# Altium schematic symbol library BARKO_SCHLIB.SchLib: 1064 symbols (part 2 of 11)
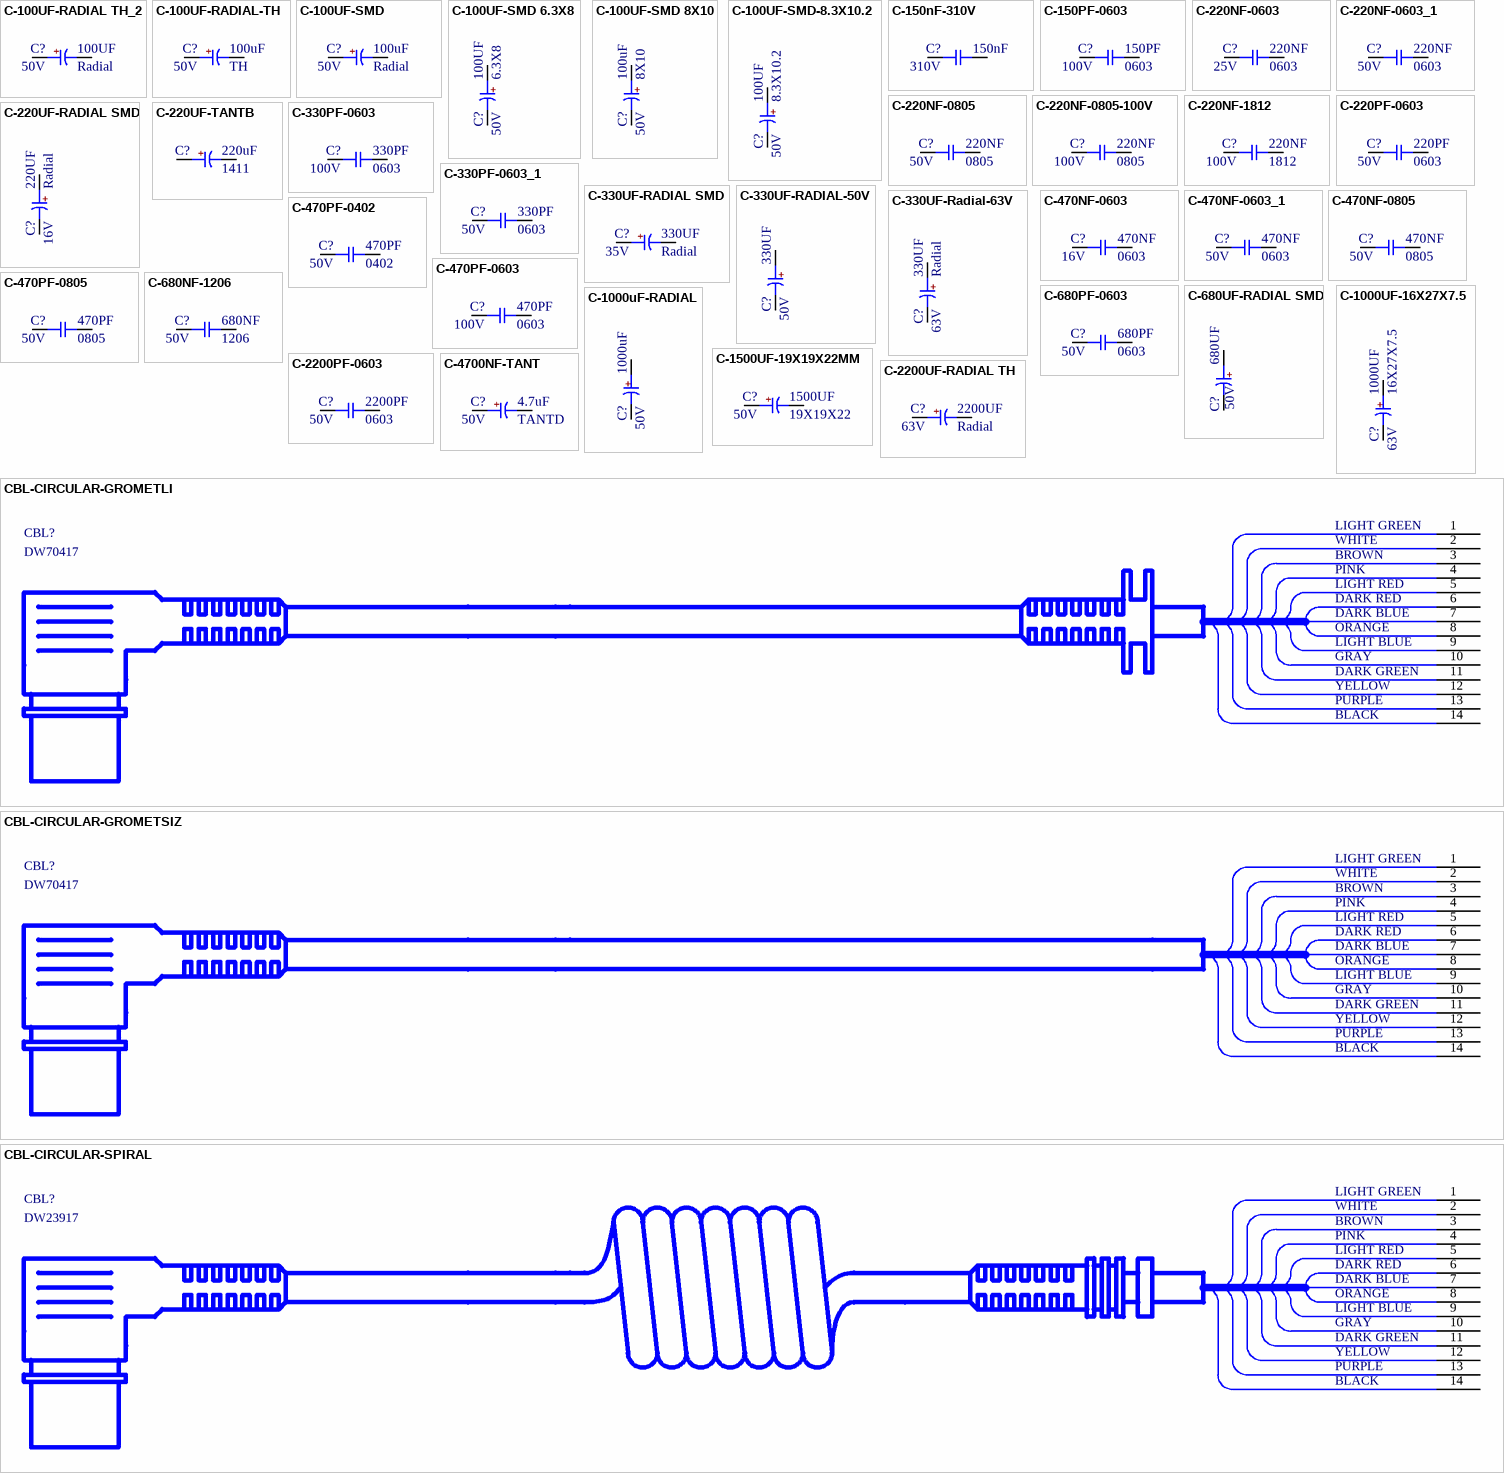
[diagram p42: symbols C-100UF-RADIAL TH_2 to CBL-CIRCULAR-SPIRAL]

## C-2200UF-RADIAL TH
designator C?, comment 2200UF  Case/Package: Radial  Voltage Rating: 63V
CAP ALUM 2200UF 63V 20% RADIAL; Manufacturer: Nichicon; Manufacturer Part Number: UVK1J222MHD; Capacitance: 2.2mF; Ripple Current: 2.3A; Leakage Current: 4.158mA; Life (Hours): 2000Hour; Lead Diameter: 0.8mm; Dielectric Material: Aluminium; Dissipation Factor: 0.1%; .PCBCHK: USED; .Creator: F:TALI; Washability: OK; ComponentLink1URL: http://www.nichicon.co.jp/english/products/pdfs/e-vr.pdf; ComponentLink1Description: http://www.nichicon.co.jp/english/products/pdfs/e-vr.pdf; ComponentLink2URL: http://nichicon-us.com/english/products/pdfs/e-mi_tape.pdf; ComponentLink2Description: http://nichicon-us.com/english/products/pdfs/e-mi_tape.pdf; ComponentLink3URL: http://components.arrow.com/part/dataview/41714523S7264371N1432; ComponentLink3Description: http://components.arrow.com/part/dataview/41714523S7264371N1432; ComponentLink4URL: http://www.alliedelec.com/m/d/2079ee50b23aa24d1fe62a3e164465c7.pdf; ComponentLink4Description: http://www.alliedelec.com/m/d/2079ee50b23aa24d1fe62a3e164465c7.pdf; ComponentLink5URL: http://products.nichicon.co.jp/en/pdf/XJA043/e-vr.pdf; ComponentLink5Description: http://products.nichicon.co.jp/en/pdf/XJA043/e-vr.pdf; ComponentLink6URL: https://www.verical.com/server-webapp/html/getDatasheet?partID=54724; ComponentLink6Description: https://www.verical.com/server-webapp/html/getDatasheet?partID=54724; Supplier 1: Digi-Key; Supplier Part Number 1: 493-12411-ND; Stock 1: 393; Pricing 1: 1=2.11, 10=1.705, 100=1.3023, 500=0.9922, 1000=0.86818, 2500=0.83718, 5000=0.80617 (USD); Mount: Through Hole; Min Operating Temperature: -40°C; Max Operating Temperature: 85°C; Tolerance: 20%; Packaging: Bulk; Package Quantity: 50; Voltage Rating (DC): 63V; Termination: Radial; Features: General Purpose; Diameter: 18mm; Length: 35.5mm; Height: 35.5mm; Lead Pitch: 7.5mm; Height - Seated (Max): 1.476inch; Radiation Hardening: No; ComponentLink7URL: http://www.nichicon.co.jp/english/products/pdfs/e-vk.pdf; ComponentLink7Description: http://www.nichicon.co.jp/english/products/pdfs/e-vk.pdf; ComponentLink8URL: http://www.mouser.com/ds/2/293/e-uvk-880083.pdf; ComponentLink8Description: http://www.mouser.com/ds/2/293/e-uvk-880083.pdf; Supplier 2: Digi-Key; Supplier Part Number 2: 493-1130-ND; Stock 2: 148; Pricing 2: 1=2.06, 10=1.663, 100=1.2703, 500=0.96784, 1000=0.84687, 2500=0.81662, 5000=0.78638 (USD); Weight: 0.01lb; Contact Plating: Matte,Tin; Voltage: 63V; Width: 0.75inch; REACH SVHC: No SVHC; Lead Free: Lead Free; .SCHCHK: USED
pins: 1, 2
text: +

## C-4700NF-TANT
designator C?, comment Voltage Rating (DC): 50V  Capacitance: 4.7uF  Case/Package: TANTD  (hidden comment: 4700NF)
CAP TANT 4.7UF 50V 10% 2917; Manufacturer: KEMET; Manufacturer Part Number: T491D475K050AT; Dielectric Material: Tantalum; Tolerance: 20%; ESR (Equivalent Series Resistance): 1.4R; Polarity: Polar; Dissipation Factor: 6%; Leakage Current: 6uA; Life (Hours): 2000Hour; .PCBCHK: USED; .Creator: F:TALI; Washability: OK; Supplier 1: Digi-Key; Stock 1: 57155; Pricing 1: 1=1.38, 10=1.087, 100=0.8151 (USD); Mount: PCB,Surface Mount; Number of Pins: 2; Case Code (Imperial): 2917; Case Code (Metric): 7343; Min Operating Temperature: -55°C; Max Operating Temperature: 125°C; Packaging: Tape and Reel; Voltage Rating: 50V; Termination: SMD/SMT; Package Quantity: 1; Voltage: 50V; Features: General Purpose; Length: 7.3mm; Height: 2.8mm; Depth: 4.3mm; Width: 4.3mm; Height - Seated (Max): 0.122inch; Radiation Hardening: No; Lead Free: Lead Free; REACH SVHC: No SVHC; ComponentLink1URL: http://www.mouser.com/ds/2/212/KEM_T2005_T491-1093550.pdf; ComponentLink1Description: http://www.mouser.com/ds/2/212/KEM_T2005_T491-1093550.pdf; ComponentLink2URL: https://www.alliedelec.com/m/d/1172a60f7bb3eb66344f86e8fb9ddbde.pdf; ComponentLink2Description: https://www.alliedelec.com/m/d/1172a60f7bb3eb66344f86e8fb9ddbde.pdf; ComponentLink3URL: https://api.kemet.com/component-edge/download/datasheet/T491D475K050AT.pdf; ComponentLink3Description: https://api.kemet.com/component-edge/download/datasheet/T491D475K050AT.pdf; ComponentLink4URL: http://uk.rs-online.com/webdocs/1515/0900766b81515551.pdf; ComponentLink4Description: http://uk.rs-online.com/webdocs/1515/0900766b81515551.pdf; ComponentLink5URL: https://www.distrelec.biz/Web/Downloads/_t/ds/KEM_T2005_T491_eng_tds.pdf?mime=application%2Fpdf; ComponentLink5Description: https://www.distrelec.biz/Web/Downloads/_t/ds/KEM_T2005_T491_eng_tds.pdf?mime=application%2Fpdf; ComponentLink6URL: http://www.jameco.com/Jameco/Products/ProdDS/1574461.pdf; ComponentLink6Description: http://www.jameco.com/Jameco/Products/ProdDS/1574461.pdf; ComponentLink7URL: http://datasheet.iiic.cc/kemet/T491D475K050AT.pdf; ComponentLink7Description: http://datasheet.iiic.cc/kemet/T491D475K050AT.pdf; Supplier Part Number 1: 399-3792-6-ND; .SCHCHK: USED
footprint C-TANTD-7343
pins: 1, 2
text: +

## CBL-CIRCULAR-GROMETLI
designator CBL?  Manufacturer Part Number: DW70417  (hidden comment: *)
HS-SPIR 14x0,10MMx1400MM GR - CIRCULAR KABLO; .Creator: M.OZKAN; .PCBCHK: USED; .SCHCHK: USED
pins: 1 LIGHT GREEN, 2 WHITE, 3, 4, 5, 6, 7, 8, 9, 10, 11, 12, 13, 14
text: BROWN; PINK; LIGHT RED; DARK RED; DARK BLUE; ORANGE; LIGHT BLUE; GRAY; DARK GREEN; YELLOW; PURPLE; BLACK

## CBL-CIRCULAR-GROMETSIZ
designator CBL?  Manufacturer Part Number: DW70417  (hidden comment: *)
HS-SPIR 14x0,10MMx1400MM GR - CIRCULAR KABLO; .Creator: M.OZKAN; .PCBCHK: USED; .SCHCHK: USED
pins: 1 LIGHT GREEN, 2 WHITE, 3, 4, 5, 6, 7, 8, 9, 10, 11, 12, 13, 14
text: BROWN; PINK; LIGHT RED; DARK RED; DARK BLUE; ORANGE; LIGHT BLUE; GRAY; DARK GREEN; YELLOW; PURPLE; BLACK

## CBL-CIRCULAR-SPIRAL
designator CBL?  Manufacturer Part Number: DW23917  (hidden comment: *)
HS-8PIR 14x0,10MM 2x1932MM - SPIRAL CIRCULAR KABLO; .Creator: M.OZKAN; .PCBCHK: USED; .SCHCHK: USED
pins: 1 LIGHT GREEN, 2 WHITE, 3, 4, 5, 6, 7, 8, 9, 10, 11, 12, 13, 14
text: BROWN; PINK; LIGHT RED; DARK RED; DARK BLUE; ORANGE; LIGHT BLUE; GRAY; DARK GREEN; YELLOW; PURPLE; BLACK

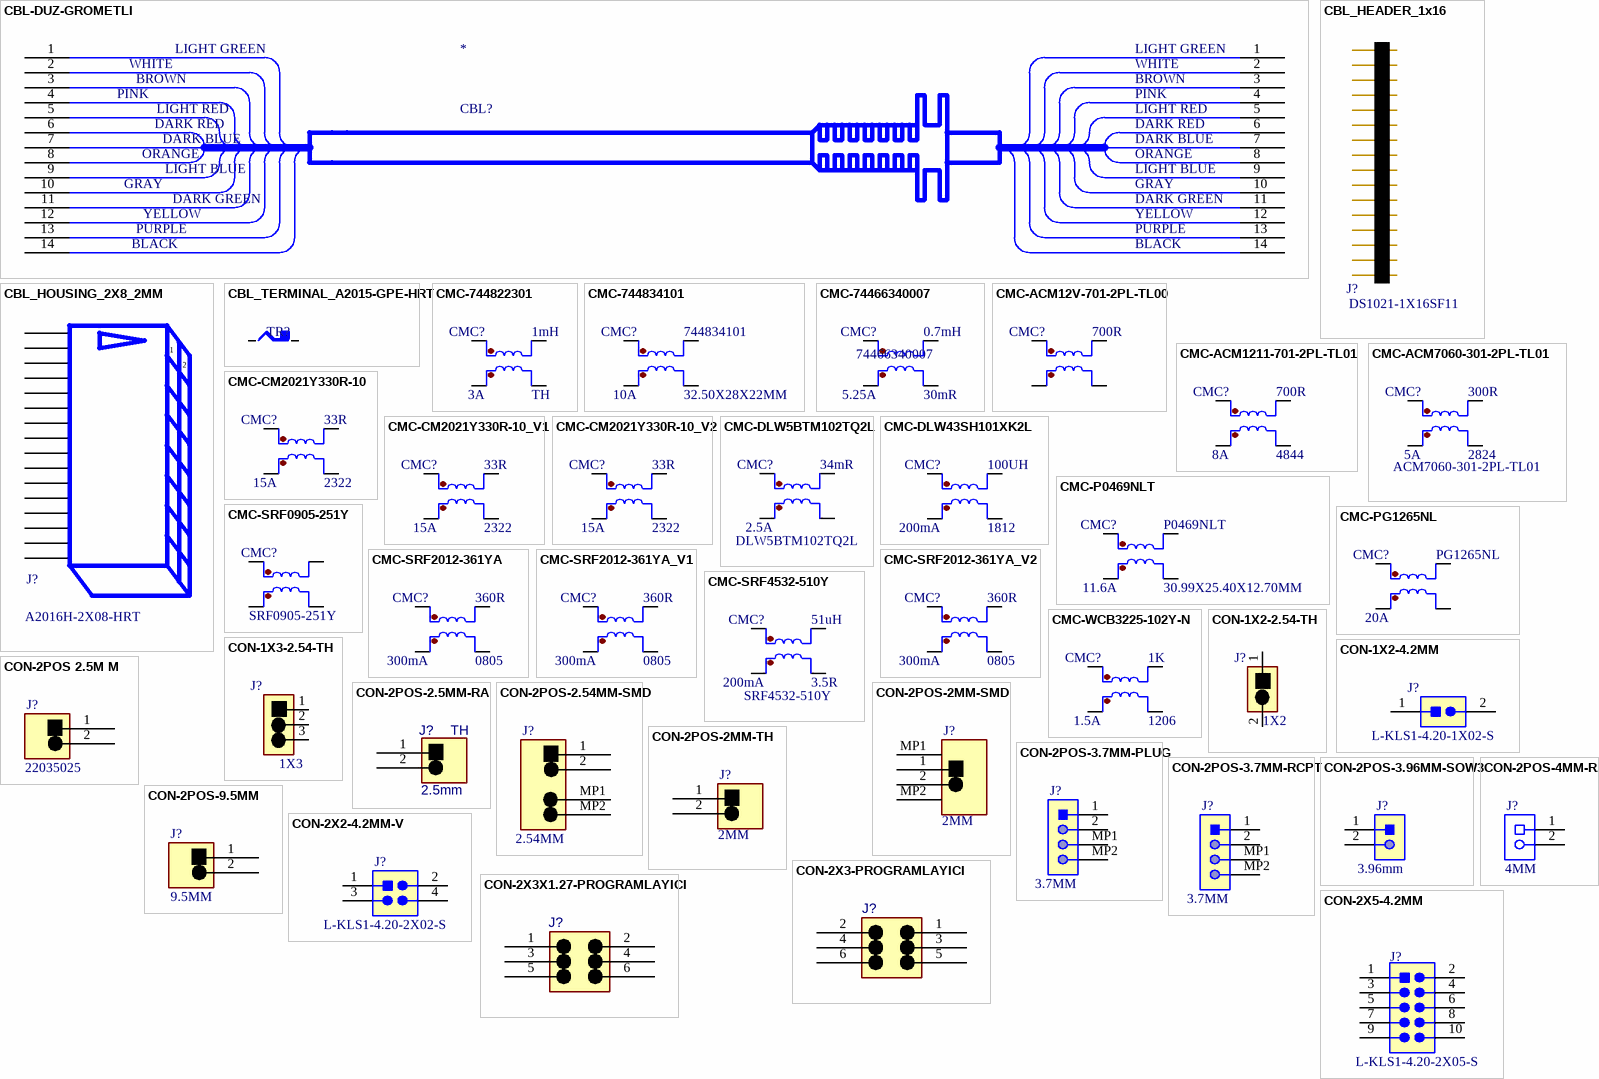
[diagram p4: symbols CBL-DUZ-GROMETLI to CON-2X5-4.2MM]

## CBL-DUZ-GROMETLI
designator CBL?
.Creator: M.OZKAN; .PCBCHK: USED; .SCHCHK: USED; Manufacturer Part Number: *
pins: 1 LIGHT GREEN, 1 LIGHT GREEN, 2 WHITE, 2 WHITE, 3, 3, 4, 4, 5, 5, 6, 6, 7, 7, 8, 8, 9, 9, 10, 10, 11, 11, 12, 12, 13, 13, 14, 14
text: BROWN; PINK; LIGHT RED; DARK RED; DARK BLUE; ORANGE; LIGHT BLUE; GRAY; DARK GREEN; YELLOW; PURPLE; BLACK

## CBL_HEADER_1x16
designator J?  Manufacturer Part Number: DS1021-1X16SF11  (hidden comment: *)
PIN HEADER 16PIN(1X16) 2.54mm THT V/T; .Creator: M.OZKAN; .PCBCHK: USED; .SCHCHK: USED
pins: 1 LIGHT GREEN, 2 WHITE, 3, 4, 5, 6, 7, 8, 9, 10, 11, 12, 13, 14, 15 14, 16 14

## CBL_HOUSING_2X8_2MM
designator J?  Manufacturer Part Number: A2016H-2X08-HRT  (hidden comment: *)
SOKET 2X8; .Creator: M.OZKAN; .PCBCHK: USED; .SCHCHK: USED
pins: 1 LIGHT GREEN, 2 WHITE, 3, 4, 5, 6, 7, 8, 9, 10, 11, 12, 13, 14, 15 13, 16 14

## CBL_TERMINAL_A2015-GPE-HRT
designator TR?  (value not drawn)
PHOSPHOR BRONZE, GOLD FLASH TERMINAL; Manufacturer Part Number: A2015-GPE-HRT; .Creator: M.OZKAN; .PCBCHK: USED; .SCHCHK: USED
pins: 17, 17

## CMC-744822301
designator CMC?, comment Max DC Current: 3A  Case/Package: TH  (hidden comment: 1mH)
CMC 1MH 3A 2LN TH; Manufacturer: Wurth Electronics; Manufacturer Part Number: 744822301; Tolerance: 30%; Number of Lines: 2; DC Resistance (DCR): 35mR; Test Frequency: 10kHz; .PCBCHK: USED; .Creator: F:TALI; Washability: OK; Supplier 1: Digi-Key; Stock 1: 422; Pricing 1: 1=4.29, 10=4.222, 50=3.349, 140=3.203, 280=2.912 (USD); Mount: Radial,Through Hole; Number of Pins: 4; Min Operating Temperature: -40°C; Max Operating Temperature: 125°C; Package Quantity: 140; Packaging: Bulk; Current: 3A; Termination: Radial; Inductance Tolerance: 30%; Resistance: 35MR; Current Rating: 3A; Series Resistance: 35mR; Length: 17.5mm; Height: 22mm; Width: 13mm; Depth: 13mm; Lead Pitch: 7.7mm; REACH SVHC: No SVHC; Lead Free: Lead Free; ComponentLink1URL: http://documents.rs-components.com/techlib://itc_doclist_GB.htm?stockno=4890201; ComponentLink1Description: http://documents.rs-components.com/techlib://itc_doclist_GB.htm?stockno=4890201; ComponentLink2URL: https://katalog.we-online.de/pbs/datasheet/744822301.pdf; ComponentLink2Description: https://katalog.we-online.de/pbs/datasheet/744822301.pdf; ComponentLink3URL: http://www.mouser.com/ds/2/445/744822301-91864.pdf; ComponentLink3Description: http://www.mouser.com/ds/2/445/744822301-91864.pdf; ComponentLink4URL: http://www.farnell.com/datasheets/1736520.pdf; ComponentLink4Description: http://www.farnell.com/datasheets/1736520.pdf; Supplier Part Number 1: 732-1439-ND; .SCHCHK: USED; Inductance: 1mH
pins: 1, 2, 3, 4

## CMC-744834101
designator CMC?, comment 744834101  Current Rating (Max): 10A  Package: 32.50X28X22MM
COMMON MODE CHOKE 1MH 10A 2LN TH; .Creator: F:TALI; .PCBCHK: USED; Washability: OK; .SCHCHK: USED
footprint CMC-744834101
pins: 1, 2, 3, 4

## CMC-74466340007
designator CMC?, comment 74466340007  Current: 5.25A  DC Resistance (DCR): 30mR  Inductance: 0.7mH
CHOKE COM MODE .7MH 4.0A SMD; Manufacturer: Wurth Electronics; Number of Lines: 2; Tolerance: 30%; Max DC Current: 4A; Washability: OK; .Creator: M.OZKAN; .PCBCHK: USED; Supplier 1: Digi-Key; Manufacturer Part Number: 74466340007; Stock 1: 1416; Pricing 1: 1=6.05000, 10=5.88000, 50=5.60000, 100=5.32000 (USD); RoHS: Yes; Mount: Surface Mount; Case/Package: SMD/SMT; Min Operating Temperature: -40°C; Max Operating Temperature: 125°C; Package Quantity: 1; Packaging: Tape and Reel; Length: 0.917inch; Height: 0.453inch; Width: 0.728inch; Depth: 23.3mm; ComponentLink1URL: https://datasheet.ciiva.com/1008/74466340007-1008595.pdf?src-supplier=Digi-Key; ComponentLink1Description: https://datasheet.ciiva.com/1008/74466340007-1008595.pdf?src-supplier=Digi-Key; ComponentLink2URL: https://datasheet.ciiva.com/11800/0900766b80d89638-11800510.pdf?src-supplier=RSComponents; ComponentLink2Description: https://datasheet.ciiva.com/11800/0900766b80d89638-11800510.pdf?src-supplier=RSComponents; ComponentLink3URL: https://datasheet.ciiva.com/1008/74466340007-1008596.pdf?src-supplier=Digi-Key; ComponentLink3Description: https://datasheet.ciiva.com/1008/74466340007-1008596.pdf?src-supplier=Digi-Key; ComponentLink4URL: https://datasheet.ciiva.com/1008/74466340007-1008597.pdf?src-supplier=Digi-Key; ComponentLink4Description: https://datasheet.ciiva.com/1008/74466340007-1008597.pdf?src-supplier=Digi-Key; Supplier Part Number 1: 732-1858-1-ND; .SCHCHK: USED
footprint SMD23.3x18.5x11.5_4P (SMD Common Mode Power Line Choke, 4 leads)
pins: 1, 2, 3, 4

## CMC-ACM12V-701-2PL-TL00
designator CMC?, comment 700R
CMC 8A 2LN 700 OHM SMD AEC-Q200; Manufacturer: TDK EPCOS; Manufacturer Part Number: ACM12V-701-2PL-TL00; Core Material: Ferrite; Number of Lines: 2; DC Resistance (DCR): 6mR; Test Frequency: 100MHz; Insulation Resistance: 10MR; Shielding: Shielded; Washability: OK; .Creator: M.OZKAN; .PCBCHK: USED; ComponentLink1URL: https://datasheet.ciiva.com/1126/320973-1126960.pdf?src-supplier=Element14; ComponentLink1Description: https://datasheet.ciiva.com/1126/320973-1126960.pdf?src-supplier=Element14; ComponentLink2URL: https://datasheet.ciiva.com/6214/e9713-acm-v-6214330.pdf?src-supplier=Digi-Key; ComponentLink2Description: https://datasheet.ciiva.com/6214/e9713-acm-v-6214330.pdf?src-supplier=Digi-Key; ComponentLink3URL: https://datasheet.ciiva.com/6214/e9713-acm-v-6214331.pdf?src-supplier=Digi-Key; ComponentLink3Description: https://datasheet.ciiva.com/6214/e9713-acm-v-6214331.pdf?src-supplier=Digi-Key; ComponentLink4URL: https://datasheet.ciiva.com/4942/e9713-acm-v-13660-4942158.pdf?src-supplier=Mouser; ComponentLink4Description: https://datasheet.ciiva.com/4942/e9713-acm-v-13660-4942158.pdf?src-supplier=Mouser; Supplier 1: Digi-Key; Supplier Part Number 1: 445-4083-1-ND; Stock 1: 65877; Pricing 1: 1=2.71000, 10=2.50500, 100=1.75330 (USD); RoHS: Yes; Mount: Surface Mount; Case/Package: V; Case Code (Metric): 1211; Min Operating Temperature: -40°C; Max Operating Temperature: 125°C; Impedance: 700R; Package Quantity: 1; Packaging: Tape and Reel; Current Rating: 8A; Current: 8A; Max DC Current: 8A; Termination: SMD/SMT; DC Current: 8A; Length: 12mm; Height: 6mm; Width: 0.433inch; Depth: 11.3mm; REACH SVHC: No SVHC; Lead Free: Lead Free; .SCHCHK: USED
footprint CMC-ACM12V-701-2PL-TL00 (CMC 8A 2LN 700 OHM SMD AEC-Q200)
pins: 1, 2, 3, 4

## CMC-ACM1211-701-2PL-TL01
designator CMC?, comment Max DC Current: 8A  Case/Package: 4844  (hidden comment: 700R)
CMC 8A 2LN 700 OHM SMD; Manufacturer: TDK; Manufacturer Part Number: ACM1211-701-2PL-TL01; Number of Lines: 2; Voltage Rating: 50V; DC Resistance (DCR): 6mR; Test Frequency: 100MHz; Voltage Rating (DC): 80V; Element Configuration: Dual; Shielding: Unshielded; .PCBCHK: USED; .Creator: F:TALI; Washability: OK; Supplier 1: Digi-Key; Stock 1: 30969; Pricing 1: 1=2.47, 10=2.277, 100=1.5939 (USD); Mount: Surface Mount; Number of Pins: 4; Min Operating Temperature: -40°C; Max Operating Temperature: 85°C; Packaging: Tape and Reel; Number of Elements: 2; Package Quantity: 1; Current Rating: 8A; Termination: SMD/SMT; Current: 8A; Length: 12.3mm; Height: 6mm; Width: 11mm; Depth: 11.3mm; Radiation Hardening: No; Lead Free: Lead Free; ComponentLink1URL: https://product.tdk.com/info/en/catalog/datasheets/cmf_commercial_power_acm1211_en.pdf; ComponentLink1Description: https://product.tdk.com/info/en/catalog/datasheets/cmf_commercial_power_acm1211_en.pdf; ComponentLink2URL: http://www.tdk.co.jp/tefe02/e9713_acm.pdf; ComponentLink2Description: http://www.tdk.co.jp/tefe02/e9713_acm.pdf; DC Current: 8A; Supplier Part Number 1: 445-2212-6-ND; .SCHCHK: USED; Impedance: 700R
pins: 1, 2, 3, 4

## CMC-ACM7060-301-2PL-TL01
designator CMC?, comment ACM7060-301-2PL-TL01  Impedance: 300R  Case/Package: 2824  DC Current: 5A
CMC 5A 2LN 300 OHM SMD; Manufacturer: TDK; DC Resistance (DCR): 10mR; Test Frequency: 100MHz; Voltage Rating (DC): 80V; Number of Lines: 2; Element Configuration: Dual; Shielding: Unshielded; Washability: OK; .Creator: M.OZKAN; .PCBCHK: USED; Supplier 1: Digi-Key; Supplier Part Number 1: 445-2214-1-ND; Manufacturer Part Number: ACM7060-301-2PL-TL01; Stock 1: 72217; Pricing 1: 1=2.02000, 10=1.86300, 100=1.30410, 500=1.05570 (USD); RoHS: Yes; Mount: Surface Mount; Number of Pins: 4; Min Operating Temperature: -40°C; Max Operating Temperature: 85°C; Package Quantity: 1; Packaging: Tape and Reel; Max DC Current: 5A; Termination: SMD/SMT; Voltage Rating: 80V; Current Rating: 5A; Current: 5A; Insulation Resistance: 10MR; Length: 7.2mm; Height: 3.5mm; Width: 0.236inch; Depth: 6.2mm; Radiation Hardening: No; REACH SVHC: No SVHC; Lead Free: Lead Free; ComponentLink1URL: https://datasheet.ciiva.com/15191/getdatasheetpartid-659291-15191802.pdf?src-supplier=Verical; ComponentLink1Description: https://datasheet.ciiva.com/15191/getdatasheetpartid-659291-15191802.pdf?src-supplier=Verical; ComponentLink2URL: https://datasheet.ciiva.com/6216/e9713-acm-6216069.pdf?src-supplier=Digi-Key; ComponentLink2Description: https://datasheet.ciiva.com/6216/e9713-acm-6216069.pdf?src-supplier=Digi-Key; ComponentLink3URL: https://datasheet.ciiva.com/4942/e9713-acm-16715-4942071.pdf?src-supplier=Mouser; ComponentLink3Description: https://datasheet.ciiva.com/4942/e9713-acm-16715-4942071.pdf?src-supplier=Mouser; ComponentLink4URL: https://datasheet.ciiva.com/6216/e9713-acm-6216072.pdf?src-supplier=Digi-Key; ComponentLink4Description: https://datasheet.ciiva.com/6216/e9713-acm-6216072.pdf?src-supplier=Digi-Key; ComponentLink5URL: https://datasheet.ciiva.com/28376/e9713-acm-28376280.pdf?src-supplier=Avnet+Europe; ComponentLink5Description: https://datasheet.ciiva.com/28376/e9713-acm-28376280.pdf?src-supplier=Avnet+Europe; ComponentLink6URL: https://datasheet.ciiva.com/22726/1866262-22726282.pdf?src-supplier=Element14; ComponentLink6Description: https://datasheet.ciiva.com/22726/1866262-22726282.pdf?src-supplier=Element14; ComponentLink7URL: https://datasheet.ciiva.com/22726/1866262-22726284.pdf?src-supplier=Element14; ComponentLink7Description: https://datasheet.ciiva.com/22726/1866262-22726284.pdf?src-supplier=Element14; ComponentLink8URL: https://datasheet.ciiva.com/6216/e9713-acm-6216078.pdf?src-supplier=Digi-Key; ComponentLink8Description: https://datasheet.ciiva.com/6216/e9713-acm-6216078.pdf?src-supplier=Digi-Key; .SCHCHK: USED
footprint FB-2824
pins: 1, 2, 3, 4

## CMC-CM2021Y330R-10
designator CMC?, comment Case Code (Imperial): 2322  Max DC Current: 15A  (hidden comment: 33R)
CMC 15A 2LN 33 OHM SMD; Manufacturer: Laird; Manufacturer Part Number: CM2021Y330R-10; Shielding: Unshielded; Number of Lines: 2; Test Frequency: 100MHz; .PCBCHK: USED; .Creator: F:TALI; DC Resistance (DCR): 0.75mR; Washability: OK; Supplier 1: Digi-Key; Stock 1: 77458; Pricing 1: 1=0.71, 10=0.621, 100=0.4437, 500=0.37268, 1000=0.3017 (USD); Mount: Surface Mount; Case/Package: 2021; Weight: 0.0128oz; Case Code (Metric): 5956; Min Operating Temperature: -40°C; Max Operating Temperature: 125°C; Package Quantity: 1; Packaging: Tape and Reel; Current Rating: 15A; Termination: SMD/SMT; Current: 15A; Frequency: 100MHz; Length: 0.231inch; Height: 3.8mm; Width: 5.6mm; Depth: 5.7mm; REACH SVHC: No SVHC; Lead Free: Lead Free; ComponentLink1URL: http://www.farnell.com/datasheets/1685869.pdf; ComponentLink1Description: http://www.farnell.com/datasheets/1685869.pdf; ComponentLink2URL: http://lairdtech.thomasnet.com/Asset/CM2021Y330R-10-E-2.pdf; ComponentLink2Description: http://lairdtech.thomasnet.com/Asset/CM2021Y330R-10-E-2.pdf; Supplier Part Number 1: 240-2502-6-ND; .SCHCHK: USED; Impedance: 33R
footprint CMC-CM2021Y330R
pins: 1, 2, 3, 4

## CMC-CM2021Y330R-10_V1
designator CMC?, comment Case Code (Imperial): 2322  Max DC Current: 15A  (hidden comment: 33R)
CMC 15A 2LN 33 OHM SMD; Manufacturer: Laird; Manufacturer Part Number: CM2021Y330R-10; Shielding: Unshielded; Number of Lines: 2; Test Frequency: 100MHz; .PCBCHK: USED; .Creator: F:TALI; DC Resistance (DCR): 0.75mR; Washability: OK; Supplier 1: Digi-Key; Stock 1: 77458; Pricing 1: 1=0.71, 10=0.621, 100=0.4437, 500=0.37268, 1000=0.3017 (USD); Mount: Surface Mount; Case/Package: 2021; Weight: 0.0128oz; Case Code (Metric): 5956; Min Operating Temperature: -40°C; Max Operating Temperature: 125°C; Package Quantity: 1; Packaging: Tape and Reel; Current Rating: 15A; Termination: SMD/SMT; Current: 15A; Frequency: 100MHz; Length: 0.231inch; Height: 3.8mm; Width: 5.6mm; Depth: 5.7mm; REACH SVHC: No SVHC; Lead Free: Lead Free; ComponentLink1URL: http://www.farnell.com/datasheets/1685869.pdf; ComponentLink1Description: http://www.farnell.com/datasheets/1685869.pdf; ComponentLink2URL: http://lairdtech.thomasnet.com/Asset/CM2021Y330R-10-E-2.pdf; ComponentLink2Description: http://lairdtech.thomasnet.com/Asset/CM2021Y330R-10-E-2.pdf; Supplier Part Number 1: 240-2502-6-ND; .SCHCHK: USED; Impedance: 33R
footprint CMC-CM2021Y330R
pins: 1, 2, 3, 4

## CMC-CM2021Y330R-10_V2
designator CMC?, comment Case Code (Imperial): 2322  Max DC Current: 15A  (hidden comment: 33R)
CMC 15A 2LN 33 OHM SMD; Manufacturer: Laird; Manufacturer Part Number: CM2021Y330R-10; Shielding: Unshielded; Number of Lines: 2; Test Frequency: 100MHz; .PCBCHK: USED; .Creator: F:TALI; DC Resistance (DCR): 0.75mR; Washability: OK; Supplier 1: Digi-Key; Stock 1: 77458; Pricing 1: 1=0.71, 10=0.621, 100=0.4437, 500=0.37268, 1000=0.3017 (USD); Mount: Surface Mount; Case/Package: 2021; Weight: 0.0128oz; Case Code (Metric): 5956; Min Operating Temperature: -40°C; Max Operating Temperature: 125°C; Package Quantity: 1; Packaging: Tape and Reel; Current Rating: 15A; Termination: SMD/SMT; Current: 15A; Frequency: 100MHz; Length: 0.231inch; Height: 3.8mm; Width: 5.6mm; Depth: 5.7mm; REACH SVHC: No SVHC; Lead Free: Lead Free; ComponentLink1URL: http://www.farnell.com/datasheets/1685869.pdf; ComponentLink1Description: http://www.farnell.com/datasheets/1685869.pdf; ComponentLink2URL: http://lairdtech.thomasnet.com/Asset/CM2021Y330R-10-E-2.pdf; ComponentLink2Description: http://lairdtech.thomasnet.com/Asset/CM2021Y330R-10-E-2.pdf; Supplier Part Number 1: 240-2502-6-ND; .SCHCHK: USED; Impedance: 33R
footprint CMC-CM2021Y330R
pins: 1, 2, 3, 4

## CMC-DLW5BTM102TQ2L
designator CMC?, comment DLW5BTM102TQ2L  DC Resistance (DCR): 34mR  Max Current Rating: 2.5A
CMC 2.5A 2LN 1 KOHM SMD; Manufacturer: Murata; Number of Lines: 2; Voltage Rating (DC): 50V; Impedance: 1kR; Supplier 1: Digi-Key; Supplier Part Number 1: 490-14403-1-ND; Manufacturer Part Number: DLW5BTM102TQ2L; Pricing: 1=1.19, 10=1.102, 25=1.0168, 50=0.8474, 100=0.7966, 250=0.7119 (USD); RoHS: No; Mount: Surface Mount; Min Operating Temperature: -40°C; Max Operating Temperature: 105°C; Packaging: Tape and Reel; Length: 5mm; Width: 5mm; Lead Free: Lead Free; ComponentLink1URL: https://www.murata.com/en-us/products/productdata/8796761587742/EFLC0025.pdf?src-supplier=Digi-Key; ComponentLink1Description: https://www.murata.com/en-us/products/productdata/8796761587742/EFLC0025.pdf?src-supplier=Digi-Key; Stock: 6882
footprint CMC-DLW5BTM
pins: 1, 2, 3, 4

## CMC-DLW43SH101XK2L
designator CMC?, comment 100UH  Case/Package: 1812  DC Current: 200mA
CMC 100UH 200MA 2LN SMD AEC-Q200; Manufacturer: Murata; Manufacturer Part Number: DLW43SH101XK2L; Number of Lines: 2; Tolerance: 50%; Voltage Rating: 50V; Shielding: Unshielded; DC Resistance (DCR): 2R; Test Frequency: 1MHz; .Creator: F:TALI; .PCBCHK: USED; Washability: OK; Supplier 1: Digi-Key; Stock 1: 114520; Pricing 1: 1 = 1.25000, 10 = 1.16400, 100 = 0.84130 (USD); RoHS: Yes; Mount: Surface Mount; Weight: 0.005997oz; Case Code (Metric): 4532; Case Code (Imperial): 1812; Min Operating Temperature: -40°C; Max Operating Temperature: 125°C; Package Quantity: 1; Packaging: Tape and Reel; Current Rating: 200mA; Inductance: 100uH; Current: 200mA; Max DC Current: 200mA; Termination: SMD/SMT; Military Standard: Not; Length: 4.5mm; Height: 2.6mm; Width: 0.126inch; Depth: 3.4mm; Radiation Hardening: No; REACH SVHC: No SVHC; Lead Free: Lead Free; ComponentLink1URL: https://www.verical.com/server-webapp/html/getDatasheet?partID=442532&src-supplier=Verical; ComponentLink1Description: https://www.verical.com/server-webapp/html/getDatasheet?partID=442532&src-supplier=Verical; ComponentLink2URL: http://search.murata.co.jp/Ceramy/image/img/PDF/ENG/L0132S0197DLW43S.pdf?src-supplier=Avnet; ComponentLink2Description: http://search.murata.co.jp/Ceramy/image/img/PDF/ENG/L0132S0197DLW43S.pdf?src-supplier=Avnet; ComponentLink3URL: http://www.murata.com/en-eu/products/productdata/8796758605854/QFLC9101.pdf?src-supplier=Digi-Key; ComponentLink3Description: http://www.murata.com/en-eu/products/productdata/8796758605854/QFLC9101.pdf?src-supplier=Digi-Key; ComponentLink4URL: http://search.murata.co.jp/Ceramy/image/img/PDF/ENG/L0132S0197DLW43S.pdf?src-supplier=Avnet+Europe; ComponentLink4Description: http://search.murata.co.jp/Ceramy/image/img/PDF/ENG/L0132S0197DLW43S.pdf?src-supplier=Avnet+Europe; ComponentLink5URL: http://www.murata.com/products/catalog/pdf/k35e.pdf?src-supplier=Future+Electronics; ComponentLink5Description: http://www.murata.com/products/catalog/pdf/k35e.pdf?src-supplier=Future+Electronics; ComponentLink6URL: https://media.digikey.com/pdf/Data%20Sheets/Murata%20PDFs/DLx_Series.pdf?src-supplier=Digi-Key; ComponentLink6Description: https://media.digikey.com/pdf/Data%20Sheets/Murata%20PDFs/DLx_Series.pdf?src-supplier=Digi-Key; Supplier Part Number 1: 490-7979-1-ND; .SCHCHK: USED
footprint CMC-1812
pins: 1, 2, 3, 4

## CMC-P0469NLT
designator CMC?, comment P0469NLT  Current: 11.6A  Case/Package: 30.99X25.40X12.70MM
COMMON MODE CHOKE 11.6A 2LN SMD; Manufacturer: Pulse Electronics; Inductance: 630uH; DC Resistance (DCR): 10mR; Tolerance: 35%; Number of Lines: 2; Shielding: Unshielded; .Creator: F:TALI; .PCBCHK: USED; Washability: OK; Supplier 1: Digi-Key; Manufacturer Part Number: P0469NLT; Stock 1: 4290; Pricing 1: 1=4.24, 10=3.887 (USD); Mount: Surface Mount; Number of Pins: 4; Min Operating Temperature: -40°C; Max Operating Temperature: 120°C; Packaging: Tape and Reel; Max DC Current: 11.6A; DC Current: 11.6A; Military Standard: Not; Package Quantity: 1; Termination: SMD/SMT; Length: 30.99mm; Height: 12.7mm; Depth: 25.4mm; Width: 1inch; Radiation Hardening: No; REACH SVHC: No SVHC; ComponentLink1URL: http://uk.rs-online.com/webdocs/0fe2/0900766b80fe229e.pdf?src-supplier=RSComponents; ComponentLink1Description: http://uk.rs-online.com/webdocs/0fe2/0900766b80fe229e.pdf?src-supplier=RSComponents; ComponentLink2URL: http://productfinder.pulseeng.com/products/datasheets/SPM2007_63.pdf?src-supplier=Digi-Key; ComponentLink2Description: http://productfinder.pulseeng.com/products/datasheets/SPM2007_63.pdf?src-supplier=Digi-Key; Supplier Part Number 1: 553-1938-1-ND; .SCHCHK: USED
footprint CMC-P0469NLT
pins: 1, 2, 3, 4

## CMC-PG1265NL
designator CMC?, comment PG1265NL  Max Current Rating: 20A
COMMON MODE CHOKE 20A 2LN SMD; Manufacturer: Pulse; Number of Lines: 2; DC Resistance (DCR): 4.1mR; Supplier 1: Digi-Key; Supplier Part Number 1: 553-3913-5-ND; Manufacturer Part Number: PG1265NL; Stock: 2073; Pricing: 1=3.54, 10=3.245, 25=2.95, 50=2.478, 100=2.124, 250=2.006, 500=1.888, 1000=1.77, 2500=1.711 (USD); RoHS: Yes; Mount: Surface Mount; Min Operating Temperature: -40°C; Max Operating Temperature: 130°C; Package Quantity: 20; Packaging: Tray; Length: 1.22inch; Width: 1inch; Height: 0.5inch; ComponentLink1URL: http://productfinder.pulseeng.com/products/datasheets/P688.pdf?src-supplier=Digi-Key; ComponentLink1Description: http://productfinder.pulseeng.com/products/datasheets/P688.pdf?src-supplier=Digi-Key; ComponentLink2URL: https://productfinder.pulseeng.com/doc_type/WEB301/doc_num/P688/doc_part/P688.pdf?src-supplier=Digi-Key; ComponentLink2Description: https://productfinder.pulseeng.com/doc_type/WEB301/doc_num/P688/doc_part/P688.pdf?src-supplier=Digi-Key
footprint CMC-P0469NLT
pins: 1, 2, 3, 4

## CMC-SRF0905-251Y
designator CMC?, comment SRF0905-251Y
BOURNS   SRF0905-251Y   COMMON MODE CHOKE, 250UH, 1.2A, 50%; Core Material: Ferrite; Voltage Rating (DC): 50V; Impedance: 600R; Number of Lines: 2; Frequency: 20MHz; DC Resistance (DCR): 130mR; Test Frequency: 100kHz; Element Configuration: Dual; Washability: OK; .Creator: M.OZKAN; .PCBCHK: USED; Supplier 1: Digi-Key; Manufacturer: Bourns; Manufacturer Part Number: SRF0905-251Y; Stock 1: 23724; Pricing 1: 1=1.45000, 10=1.34600, 100=0.97290, 500=0.74520 (USD); RoHS: Yes; Mount: Surface Mount; Case/Package: 0905; Number of Pins: 4; Material: Polymer; Min Operating Temperature: -40°C; Max Operating Temperature: 105°C; Tolerance: 50%; Packaging: Tape and Reel; Package Quantity: 1000; Inductance: 250uH; Current Rating: 1.2A; Max DC Current: 1.2A; Termination: SMD/SMT; Current: 1.2A; DC Current: 1.2A; Self Resonant Frequency: 20MHz; Length: 9.2mm; Height: 5mm; Width: 6mm; Depth: 6.3mm; Radiation Hardening: No; REACH SVHC: No SVHC; ComponentLink1URL: https://datasheet.ciiva.com/4943/srf0905-32579-4943008.pdf?src-supplier=Mouser; ComponentLink1Description: https://datasheet.ciiva.com/4943/srf0905-32579-4943008.pdf?src-supplier=Mouser; ComponentLink2URL: https://datasheet.ciiva.com/1127/1831485-1127680.pdf?src-supplier=Element14; ComponentLink2Description: https://datasheet.ciiva.com/1127/1831485-1127680.pdf?src-supplier=Element14; ComponentLink3URL: https://datasheet.ciiva.com/22715/1831485-22715657.pdf?src-supplier=Element14; ComponentLink3Description: https://datasheet.ciiva.com/22715/1831485-22715657.pdf?src-supplier=Element14; ComponentLink4URL: https://datasheet.ciiva.com/30254/887srf0905-30254281.pdf?src-supplier=Onlinecomponents.com; ComponentLink4Description: https://datasheet.ciiva.com/30254/887srf0905-30254281.pdf?src-supplier=Onlinecomponents.com; ComponentLink5URL: https://datasheet.ciiva.com/6216/srf0905-6216427.pdf?src-supplier=Digi-Key; ComponentLink5Description: https://datasheet.ciiva.com/6216/srf0905-6216427.pdf?src-supplier=Digi-Key; ComponentLink6URL: https://datasheet.ciiva.com/11155/srf0905-11155307.pdf?src-supplier=Avnet; ComponentLink6Description: https://datasheet.ciiva.com/11155/srf0905-11155307.pdf?src-supplier=Avnet; ComponentLink7URL: https://datasheet.ciiva.com/6216/srf0905-6216428.pdf?src-supplier=Digi-Key; ComponentLink7Description: https://datasheet.ciiva.com/6216/srf0905-6216428.pdf?src-supplier=Digi-Key; ComponentLink8URL: https://datasheet.ciiva.com/6216/srf0905-6216431.pdf?src-supplier=Digi-Key; ComponentLink8Description: https://datasheet.ciiva.com/6216/srf0905-6216431.pdf?src-supplier=Digi-Key; Supplier Part Number 1: SRF0905-251YCT-ND; .SCHCHK: USED
footprint 4 PC Pad (0.362" L x 0.236" W (9.20mm x 6.00mm))
pins: 1, 2, 3, 4

## CMC-SRF2012-361YA
designator CMC?, comment Case/Package: 0805  Max DC Current: 300mA  (hidden comment: 360R)